# Altium footprint library LimeMicroAltiumLib_pcbLib_r01.PcbLib: 434 footprints (part 16 of 29)
Each footprint in its own frame and in the unit in brackets; x right, y up, seen from the top. Pads: shape width x height; smd on the part's side, far side on the other; paste and mask are expansions set on the pad; w line width, h text height; cw(c..) or ccw(c..) is an arc to the next point about the centre after c.
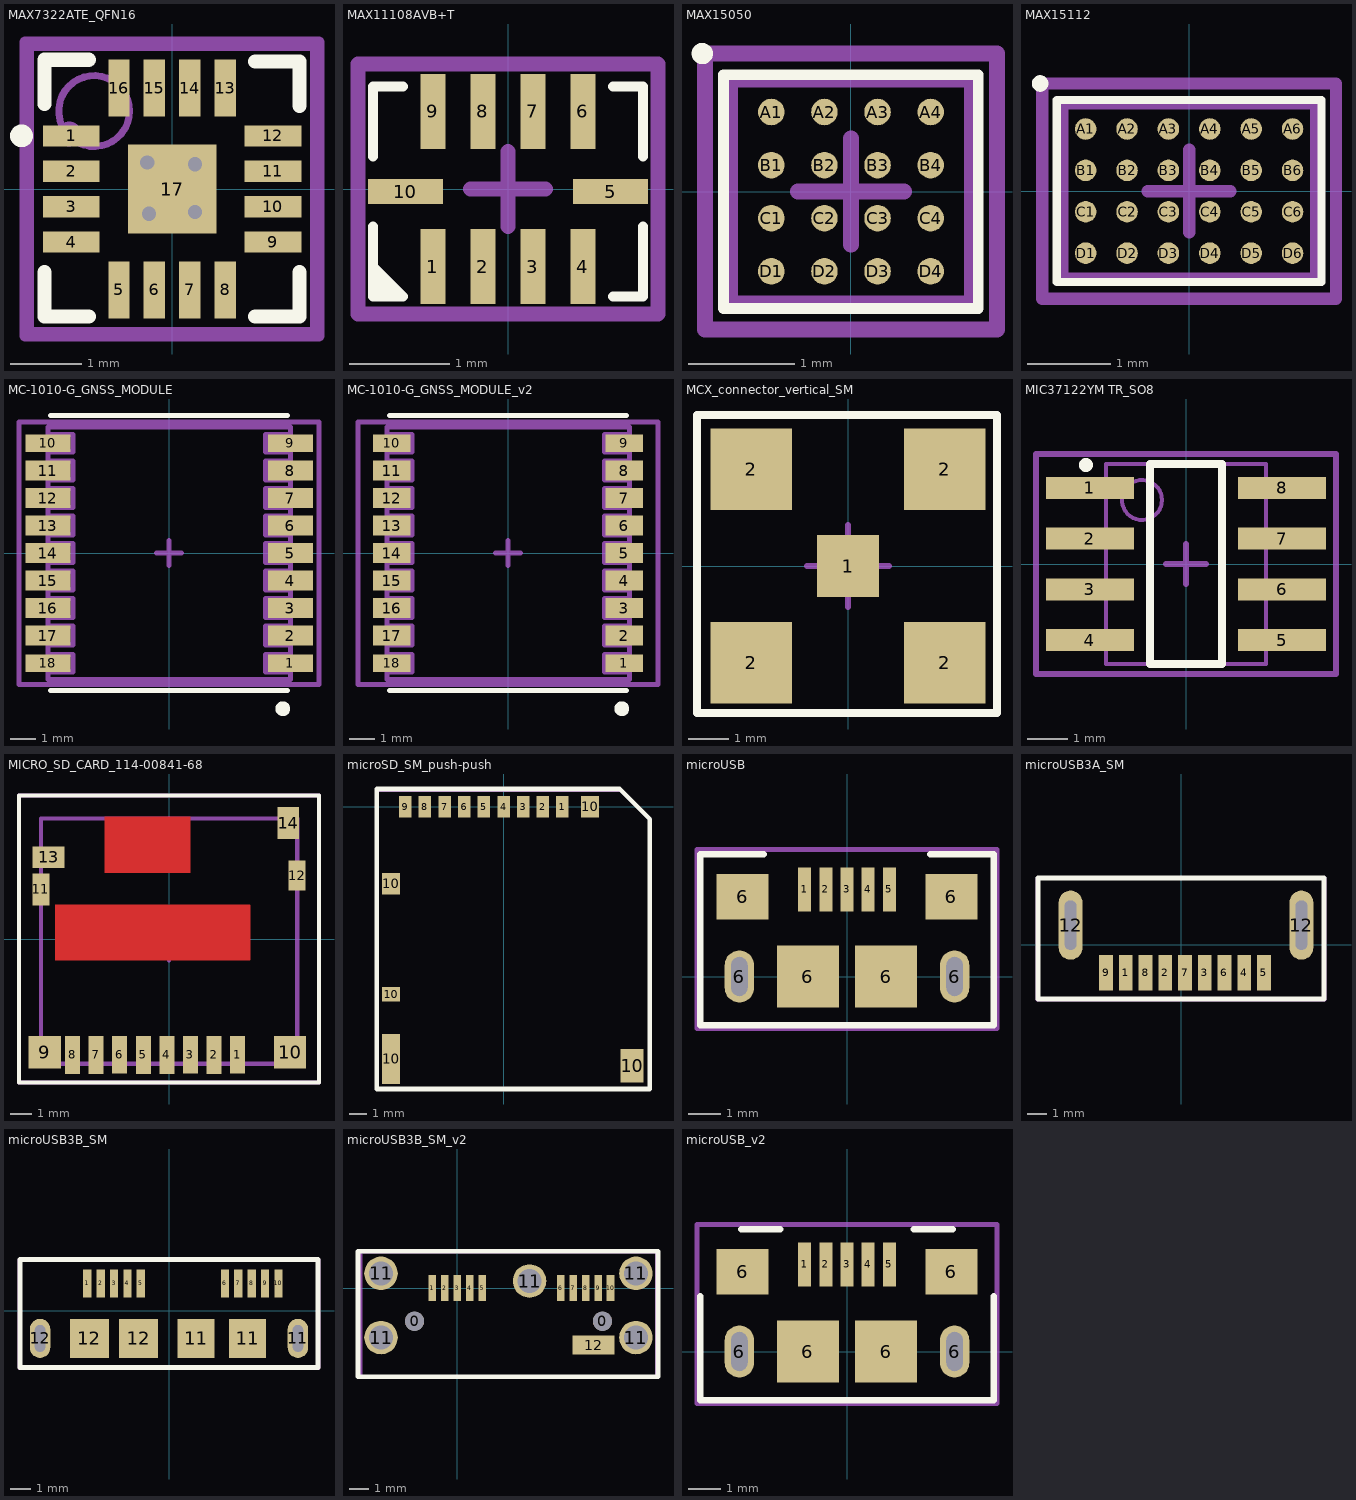
[diagram p15: the footprints below, top view; thin cyan lines are the x and y axes]

## MAX7322ATE_QFN16 [mm]
height 0.8
pads (17):
  rect 0.8x0.3 smd mask+0.05: 1(-1.425,0.75) 2(-1.425,0.25) 3(-1.425,-0.25) 4(-1.425,-0.75) 9(1.425,-0.75) 10(1.425,-0.25) 11(1.425,0.25) 12(1.425,0.75)
  rect 0.3x0.8 smd mask+0.05: 5(-0.75,-1.425) 6(-0.25,-1.425) 7(0.25,-1.425) 8(0.75,-1.425) 13(0.75,1.425) 14(0.25,1.425) 15(-0.25,1.425) 16(-0.75,1.425)
  rect 1.25x1.25 smd mask+0.05: 17(0,0)
via -0.35,0.375 diameter 0.4 hole 0.2
via 0.325,0.35 diameter 0.4 hole 0.2
via 0.325,-0.325 diameter 0.4 hole 0.2
via -0.325,-0.35 diameter 0.4 hole 0.2
Top Overlay:
  circle w0.25: c-2.125,0.75 r0.035
  lines w0.2: -1.8,-1.175 -1.8,-1.8 -1.175,-1.8 ; -1.8,1.2 -1.8,1.825 -1.175,1.825 ; 1.175,-1.8 1.8,-1.8 1.8,-1.175 ; 1.175,1.8 1.8,1.8 1.8,1.175
Mechanical 13:
  circle w0.1: c-1.1,1.1 r0.5
  lines w0.1: -2,-2 2,-2 2,2 -2,2 -2,-2
Mechanical 15:
  circle w0.35: c-1.45,0.775 r0
  lines w0.15: -0.5,0 0.5,0 ; 0,-0.5 0,0.5 ; -2.075,-2.075 2.075,-2.075 2.075,2.075 -2.075,2.075 -2.075,-2.075
  text ".Designator" at 0,0 h0.55
3D body "User Library-qfn16-3x3.step": height 0.92, standoff 0, extent -1.5,-1.5 1.5,1.5

## MAX11108AVB+T [mm]
pads (10):
  rect 0.25x0.75 smd mask+0.05: 1(-0.75,-0.775) 2(-0.25,-0.775) 3(0.25,-0.775) 4(0.75,-0.775) 6(0.75,0.775) 7(0.25,0.775) 8(-0.25,0.775) 9(-0.75,0.775)
  rect 0.75x0.25 smd mask+0.05: 5(1.025,-0.025) 10(-1.025,-0.025)
Top Overlay:
  region: -1.05,-1.075 -1.35,-0.775 -1.35,-1.075
  lines w0.1: -1.35,-0.375 -1.35,-1.075 -1.05,-1.075 -1.35,-0.775 ; -1.35,0.325 -1.35,1.025 -1.05,1.025 ; 1.05,-1.075 1.35,-1.075 1.35,-0.375 ; 1.05,1.025 1.35,1.025 1.35,0.325 ; -1.35,-0.775 -1.35,-0.775
Mechanical 15:
  circle w0.1: c-0.75,-0.75 r0.035
  lines w0.15: -0.375,0 0,0 ; 0,-0.375 0,0 ; 0,0.375 0,0 ; 0.375,0 0,0 ; -1.5,-1.25 -1.5,1.25 1.5,1.25 1.5,1.15 1.5,-1.25 1.4,-1.25 -1.5,-1.25
  text ".Designator" at 0,0 h0.55
3D body: height 0.45, standoff 0, extent -1.05,-0.8 1.05,0.8
3D body: height 0.5, standoff 0.45, extent -0.874,-0.625 -0.575,-0.325

## MAX15050 [mm] "BGA, 16-Leads, Body 2,22x2,06mmx0,25mm, Pitch 0,50mm"
height 0.25
pads (16):
  round 0.25 smd: A1(-0.75,0.75) A2(-0.25,0.75) A3(0.25,0.75) A4(0.75,0.75) B1(-0.75,0.25) B2(-0.25,0.25) B3(0.25,0.25) B4(0.75,0.25) C1(-0.75,-0.25) C2(-0.25,-0.25) C3(0.25,-0.25) C4(0.75,-0.25) D1(-0.75,-0.75) D2(-0.25,-0.75) D3(0.25,-0.75) D4(0.75,-0.75)
Top Overlay:
  circle w0.1: c-1.4,1.3 r0.05
  lines w0.1: -1.2,-1.1 -1.2,1.1 1.2,1.1 1.2,-1.1 -1.2,-1.1
Mechanical 13:
  lines w0.1: -1.115,-1.03 -1.115,1.03 1.115,1.03 1.115,-1.03 -1.115,-1.03
Mechanical 15:
  lines w0.15: -0.5,0 0.5,0 ; 0,-0.5 0,0.5 ; -1.375,-1.3 -1.375,1.3 1.375,1.3 1.375,-1.3 -1.375,-1.3
  text ".Designator" at 0,0 h0.55
  text "A1" at -1,0.6 h0.3
3D body: height 0.25, standoff 0.25, extent -1.115,-1.03 1.115,1.03

## MAX15112 [mm] "BGA, 24-Leads, Body 3,02x2,07mmx0,25mm, Pitch 0,50mm"
height 0.25
pads (24):
  round 0.26 smd: A1(-1.25,0.75) A2(-0.75,0.75) A3(-0.25,0.75) A4(0.25,0.75) A5(0.75,0.75) A6(1.25,0.75) B1(-1.25,0.25) B2(-0.75,0.25) B3(-0.25,0.25) B4(0.25,0.25) B5(0.75,0.25) B6(1.25,0.25) C1(-1.25,-0.25) C2(-0.75,-0.25) C3(-0.25,-0.25) C4(0.25,-0.25) C5(0.75,-0.25) C6(1.25,-0.25) D1(-1.25,-0.75) D2(-0.75,-0.75) D3(-0.25,-0.75) D4(0.25,-0.75) D5(0.75,-0.75) D6(1.25,-0.75)
Top Overlay:
  circle w0.1: c-1.8,1.3 r0.05
  lines w0.1: -1.6,-1.1 1.6,-1.1 1.6,1.1 -1.6,1.1 -1.6,-1.1
Mechanical 13:
  lines w0.1: -1.51,-1.035 1.51,-1.035 1.51,1.035 -1.51,1.035 -1.51,-1.035
Mechanical 15:
  lines w0.15: -0.5,0 0.5,0 ; 0,-0.5 0,0.5 ; -1.775,-1.3 1.775,-1.3 1.775,1.3 -1.775,1.3 -1.775,-1.3
  text ".Designator" at 0,0 h0.55
  text "A1" at -1.4,0.6 h0.3
3D body: height 0.25, standoff 0.25, extent -1.51,-1.035 1.51,1.035

## MC-1010-G_GNSS_MODULE [mm]
pads (18):
  rect 1.8x0.7 smd mask+0.05: 1(4.85,-4.4) 9(4.85,4.4) 10(-4.85,4.4) 18(-4.85,-4.4)
  rect 1.8x0.8 smd mask+0.05: 2(4.85,-3.3) 3(4.85,-2.2) 4(4.85,-1.1) 5(4.85,0) 6(4.85,1.1) 7(4.85,2.2) 8(4.85,3.3) 11(-4.85,3.3) 12(-4.85,2.2) 13(-4.85,1.1) 14(-4.85,0) 15(-4.85,-1.1) 16(-4.85,-2.2) 17(-4.85,-3.3)
Top Overlay:
  circle w0.3: c4.55,-6.225 r0.146
  lines w0.2: -4.75,-5.5 4.75,-5.5 ; -4.75,5.5 4.75,5.5
Mechanical 13:
  lines w0.2: -4.534,-4.434 cw(c-4.85,-4.434) -4.85,-4.75 -3.85,-4.75 -3.85,-4.05 -4.85,-4.05 cw(c-4.85,-4.366) -4.534,-4.366 ; -4.534,4.366 cw(c-4.85,4.366) -4.85,4.05 -3.85,4.05 -3.85,4.75 -4.85,4.75 cw(c-4.85,4.434) -4.534,4.434 ; 4.534,-4.434 ccw(c4.85,-4.434) 4.85,-4.75 3.85,-4.75 3.85,-4.05 4.85,-4.05 ccw(c4.85,-4.366) 4.534,-4.366 ; 4.534,4.366 ccw(c4.85,4.366) 4.85,4.05 3.85,4.05 3.85,4.75 4.85,4.75 ccw(c4.85,4.434) 4.534,4.434 ; -4.85,-5.05 -4.85,5.05 4.85,5.05 4.85,-5.05 -4.85,-5.05 ; -4.85,-3.675 ccw(c-4.85,-3.359) -4.534,-3.359 -4.534,-3.241 ccw(c-4.85,-3.241) -4.85,-2.925 -3.85,-2.925 -3.85,-3.675 -4.85,-3.675 ; -4.85,-2.575 ccw(c-4.85,-2.259) -4.534,-2.259 -4.534,-2.141 ccw(c-4.85,-2.141) -4.85,-1.825 -3.85,-1.825 -3.85,-2.575 -4.85,-2.575 ; -4.85,-1.475 ccw(c-4.85,-1.159) -4.534,-1.159 -4.534,-1.041 ccw(c-4.85,-1.041) -4.85,-0.725 -3.85,-0.725 -3.85,-1.475 -4.85,-1.475 ; -4.85,-0.375 ccw(c-4.85,-0.059) -4.534,-0.059 -4.534,0.059 ccw(c-4.85,0.059) -4.85,0.375 -3.85,0.375 -3.85,-0.375 -4.85,-0.375 ; -4.85,0.725 ccw(c-4.85,1.041) -4.534,1.041 -4.534,1.159 ccw(c-4.85,1.159) -4.85,1.475 -3.85,1.475 -3.85,0.725 -4.85,0.725 ; -4.85,1.825 ccw(c-4.85,2.141) -4.534,2.141 -4.534,2.259 ccw(c-4.85,2.259) -4.85,2.575 -3.85,2.575 -3.85,1.825 -4.85,1.825 ; -4.85,2.925 ccw(c-4.85,3.241) -4.534,3.241 -4.534,3.359 ccw(c-4.85,3.359) -4.85,3.675 -3.85,3.675 -3.85,2.925 -4.85,2.925 ; 3.85,-3.675 4.85,-3.675 cw(c4.85,-3.359) 4.534,-3.359 4.534,-3.241 cw(c4.85,-3.241) 4.85,-2.925 3.85,-2.925 3.85,-3.675 ; 3.85,-2.575 3.85,-1.825 4.85,-1.825 ccw(c4.85,-2.141) 4.534,-2.141 4.534,-2.259 ccw(c4.85,-2.259) 4.85,-2.575 3.85,-2.575 ; 3.85,-1.475 3.85,-0.725 4.85,-0.725 ccw(c4.85,-1.041) 4.534,-1.041 4.534,-1.159 ccw(c4.85,-1.159) 4.85,-1.475 3.85,-1.475 ; 3.85,-0.375 3.85,0.375 4.85,0.375 ccw(c4.85,0.059) 4.534,0.059 4.534,-0.059 ccw(c4.85,-0.059) 4.85,-0.375 3.85,-0.375 ; 3.85,0.725 4.85,0.725 cw(c4.85,1.041) 4.534,1.041 4.534,1.159 cw(c4.85,1.159) 4.85,1.475 3.85,1.475 3.85,0.725 ; 3.85,1.825 4.85,1.825 cw(c4.85,2.141) 4.534,2.141 4.534,2.259 cw(c4.85,2.259) 4.85,2.575 3.85,2.575 3.85,1.825 ; 3.85,2.925 3.85,3.675 4.85,3.675 ccw(c4.85,3.359) 4.534,3.359 4.534,3.241 ccw(c4.85,3.241) 4.85,2.925 3.85,2.925
Mechanical 15:
  lines w0.2: -0.5,0 0.5,0 ; 0,-0.5 0,0.5 ; -6,-5.25 6,-5.25 6,5.25 -6,5.25 -6,-5.25
  text "18" at -5.25,-4.75 h0.55
  text "10" at -5.25,4.25 h0.55
  text "9" at 4.75,4.25 h0.55
  text "1" at 4.75,-4.75 h0.55
  text ".Designator" at 0,0 h0.55
3D body: height 2, standoff 0, extent -4.85,-5.05 4.85,5.05

## MC-1010-G_GNSS_MODULE_v2 [mm]
pads (18):
  rect 1.5x0.7 smd mask+0.05: 1(4.65,-4.4) 9(4.65,4.4) 10(-4.65,4.4) 18(-4.65,-4.4)
  rect 1.5x0.8 smd mask+0.05: 2(4.65,-3.3) 3(4.65,-2.2) 4(4.65,-1.1) 5(4.65,0) 6(4.65,1.1) 7(4.65,2.2) 8(4.65,3.3) 11(-4.65,3.3) 12(-4.65,2.2) 13(-4.65,1.1) 14(-4.65,0) 15(-4.65,-1.1) 16(-4.65,-2.2) 17(-4.65,-3.3)
Top Overlay:
  circle w0.3: c4.55,-6.225 r0.146
  lines w0.2: -4.75,-5.5 4.75,-5.5 ; -4.75,5.5 4.75,5.5
Mechanical 13:
  lines w0.2: -4.534,-4.434 cw(c-4.85,-4.434) -4.85,-4.75 -3.85,-4.75 -3.85,-4.05 -4.85,-4.05 cw(c-4.85,-4.366) -4.534,-4.366 ; -4.534,4.366 cw(c-4.85,4.366) -4.85,4.05 -3.85,4.05 -3.85,4.75 -4.85,4.75 cw(c-4.85,4.434) -4.534,4.434 ; 4.534,-4.434 ccw(c4.85,-4.434) 4.85,-4.75 3.85,-4.75 3.85,-4.05 4.85,-4.05 ccw(c4.85,-4.366) 4.534,-4.366 ; 4.534,4.366 ccw(c4.85,4.366) 4.85,4.05 3.85,4.05 3.85,4.75 4.85,4.75 ccw(c4.85,4.434) 4.534,4.434 ; -4.85,-5.05 4.85,-5.05 4.85,5.05 -4.85,5.05 -4.85,-5.05 ; -4.85,-3.675 ccw(c-4.85,-3.359) -4.534,-3.359 -4.534,-3.241 ccw(c-4.85,-3.241) -4.85,-2.925 -3.85,-2.925 -3.85,-3.675 -4.85,-3.675 ; -4.85,-2.575 ccw(c-4.85,-2.259) -4.534,-2.259 -4.534,-2.141 ccw(c-4.85,-2.141) -4.85,-1.825 -3.85,-1.825 -3.85,-2.575 -4.85,-2.575 ; -4.85,-1.475 ccw(c-4.85,-1.159) -4.534,-1.159 -4.534,-1.041 ccw(c-4.85,-1.041) -4.85,-0.725 -3.85,-0.725 -3.85,-1.475 -4.85,-1.475 ; -4.85,-0.375 ccw(c-4.85,-0.059) -4.534,-0.059 -4.534,0.059 ccw(c-4.85,0.059) -4.85,0.375 -3.85,0.375 -3.85,-0.375 -4.85,-0.375 ; -4.85,0.725 ccw(c-4.85,1.041) -4.534,1.041 -4.534,1.159 ccw(c-4.85,1.159) -4.85,1.475 -3.85,1.475 -3.85,0.725 -4.85,0.725 ; -4.85,1.825 ccw(c-4.85,2.141) -4.534,2.141 -4.534,2.259 ccw(c-4.85,2.259) -4.85,2.575 -3.85,2.575 -3.85,1.825 -4.85,1.825 ; -4.85,2.925 ccw(c-4.85,3.241) -4.534,3.241 -4.534,3.359 ccw(c-4.85,3.359) -4.85,3.675 -3.85,3.675 -3.85,2.925 -4.85,2.925 ; 3.85,-3.675 3.85,-2.925 4.85,-2.925 ccw(c4.85,-3.241) 4.534,-3.241 4.534,-3.359 ccw(c4.85,-3.359) 4.85,-3.675 3.85,-3.675 ; 3.85,-2.575 4.85,-2.575 cw(c4.85,-2.259) 4.534,-2.259 4.534,-2.141 cw(c4.85,-2.141) 4.85,-1.825 3.85,-1.825 3.85,-2.575 ; 3.85,-1.475 4.85,-1.475 cw(c4.85,-1.159) 4.534,-1.159 4.534,-1.041 cw(c4.85,-1.041) 4.85,-0.725 3.85,-0.725 3.85,-1.475 ; 3.85,-0.375 4.85,-0.375 cw(c4.85,-0.059) 4.534,-0.059 4.534,0.059 cw(c4.85,0.059) 4.85,0.375 3.85,0.375 3.85,-0.375 ; 3.85,0.725 3.85,1.475 4.85,1.475 ccw(c4.85,1.159) 4.534,1.159 4.534,1.041 ccw(c4.85,1.041) 4.85,0.725 3.85,0.725 ; 3.85,1.825 3.85,2.575 4.85,2.575 ccw(c4.85,2.259) 4.534,2.259 4.534,2.141 ccw(c4.85,2.141) 4.85,1.825 3.85,1.825 ; 3.85,2.925 4.85,2.925 cw(c4.85,3.241) 4.534,3.241 4.534,3.359 cw(c4.85,3.359) 4.85,3.675 3.85,3.675 3.85,2.925
Mechanical 15:
  lines w0.2: -0.5,0 0.5,0 ; 0,-0.5 0,0.5 ; -6,-5.25 -6,5.25 6,5.25 6,-5.25 -6,-5.25
  text ".Designator" at 0,0 h0.55
  text "1" at 4.75,-4.75 h0.55
  text "9" at 4.75,4.25 h0.55
  text "10" at -5.25,4.25 h0.55
  text "18" at -5.25,-4.75 h0.55
3D body: height 2, standoff 0, extent -4.85,-5.05 4.85,5.05

## MCX_connector_vertical_SM [mm]
pads (5):
  rect 1.52x1.52 smd: 1(0,0)
  rect 2x2 smd: 2(-2.37,-2.37) 2(-2.37,2.37) 2(2.37,-2.37) 2(2.37,2.37)
Top Overlay:
  lines w0.2: -3.7,-3.6 -3.7,3.7 3.65,3.7 3.65,-3.6 -3.7,-3.6
Mechanical 15:
  lines w0.15: -1,0 0,0 ; 0,-1 0,0 ; 0,1 0,0 ; 1,0 0,0 ; -3.7,-3.6 3.65,-3.6 3.65,3.7 -3.7,3.7 -3.7,-3.6
  text ".Designator" at 0,0 h0.55
3D body "User Library-MCX_SMD_v1.step": height 5.9, standoff 0, extent -2.95,-2.95 2.95,2.95

## MECH_JUMPER_HALF_PITCH [mm]
3D body "User Library-PinHeader50mil.STEP": height 7.3, standoff 1.8, extent -1.25,-0.575 1.25,0.625

## MIC37122YM TR_SO8 [mm] "SOIC, 8-Leads, Body 4,90x3,90mm, Pitch 1,27mm, IPC Medium Density"
height 1.7
pads (8):
  rect 2.2x0.55 smd: 1(-2.4,1.905) 2(-2.4,0.635) 3(-2.4,-0.635) 4(-2.4,-1.905) 5(2.4,-1.905) 6(2.4,-0.635) 7(2.4,0.635) 8(2.4,1.905)
Top Overlay:
  circle w0.25: c-2.5,2.475 r0.05
  lines w0.2: -0.9,-2.5 -0.9,2.5 0.9,2.5 0.9,-2.5 -0.9,-2.5
Mechanical 13:
  circle w0.1: c-1.1,1.6 r0.5
  lines w0.1: -2,-2.5 -2,2.5 2,2.5 2,-2.5 -2,-2.5
Mechanical 15:
  circle w0.35: c-2.8,1.9 r0.1
  lines w0.15: -0.5,0 0.5,0 ; 0,-0.5 0,0.5 ; -3.75,-2.75 -3.75,2.75 3.75,2.75 3.75,-2.75 -3.75,-2.75
  text ".Designator" at 0,0 h0.55
3D body "CircuitWorks-SO-8.step": height 1.45, standoff 0, extent -2.889,-2.45 2.889,2.452

## MICRO_SD_CARD_114-00841-68 [mm]
pads (14):
  rect 0.7x1.75 smd mask+0.1: 1(3.2,-5.412) 6(-2.3,-5.412)
  rect 0.701x1.753 smd mask+0.1: 2(2.1,-5.412) 8(-4.5,-5.412)
  rect 0.701x1.752 smd mask+0.1: 3(1,-5.412) 4(-0.1,-5.412) 5(-1.2,-5.412) 7(-3.4,-5.412)
  rect 1.501x1.501 smd mask+0.1: 9(-5.8,-5.288)
  rect 1.502x1.502 smd mask+0.1: 10(5.65,-5.288)
  rect 0.801x1.501 smd mask+0.1: 11(-5.975,2.312)
  rect 0.8x1.401 smd mask+0.1: 12(5.975,2.963)
  rect 1.5x1 smd mask+0.1: 13(-5.62,3.812)
  rect 1.001x1.502 smd mask+0.1: 14(5.575,5.413)
Top Layer:
  pour cut-out: 3.8,-1 -5.3,-1 -5.3,1.6 3.8,1.6
  pour cut-out: 1,3.1 -3,3.1 -3,5.7 1,5.7
Top Overlay:
  lines w0.2: -7,-6.7 -7,6.7 7,6.7 7,-6.7 -7,-6.7
Top Solder:
  region: -6.475,3.15 -6.475,4.425 -4.75,4.425 -4.75,3.2 -5.475,3.2 -5.475,3.15
Mechanical 13:
  lines w0.2: -5.975,-5.841 -5.975,5.626 ; -5.975,-5.826 5.976,-5.826 ; -5.975,-4.145 -5.975,-0.109 ; -5.975,-0.104 -5.975,1.237 ; 4.656,5.626 -5.975,5.626 ; 5.982,-5.831 5.982,5.626 ; 5.985,-4.215 5.985,-0.104 ; 5.988,-0.105 5.988,2.043 ; 5.988,5.626 -5.975,5.626
Mechanical 15:
  lines w0.2: -1,0 0,0 ; 0,-1 0,0 ; 0,1 0,0 ; 1,0 0,0 ; -7,-6.7 -7,6.7 7,6.7 7,-6.7 -7,-6.7
  text ".Designator" at 0,0 h0.55
  text "1" at 3.1,-4.4 h0.55
  text "8" at -4.6,-4.4 h0.55
3D body "User Library-Micro SD Holder 114-00841-68.step": height 1.6, standoff 0, extent -6,-5.85 6,5.75
3D body "User Library-Micro_SD.step": height 1.45, standoff 0.47, extent -5.5,-9.9 5.5,5.1

## microSD_SM_push-push [mm]
pads (14):
  rect 0.7x1.2 smd: 1(3.3,0) 2(2.2,0) 3(1.1,0) 4(0,0) 5(-1.1,0) 6(-2.2,0) 7(-3.3,0) 8(-4.4,0) 9(-5.5,0)
  rect 1x2.8 smd: 10(-6.3,-14.11)
  rect 1x0.8 smd: 10(-6.3,-10.5)
  rect 1x1.2 smd: 10(-6.3,-4.3) 10(4.85,0)
  rect 1.3x1.9 smd: 10(7.2,-14.5)
Top Overlay:
  lines w0.254: -7.1,-15.8 8.2,-15.8 8.2,-0.7 6.5,1 -7.1,1 -7.1,-15.8
Mechanical 15:
  lines w0.15: -7.1,-15.8 8.2,-15.8 8.2,-0.675 6.625,0.9 -7,0.9 -7.1,1 -7.1,-15.8
  text ".Designator" at 0.4,-8.1 h0.55

## microUSB [mm]
pads (11):
  rect 0.4x1.35 smd mask+0.05: 1(-1.3,2.675) 2(-0.65,2.675) 3(0,2.675) 4(0.65,2.675) 5(1.3,2.675)
  oval 0.9x1.6 hole 0.5 slot 1.2 at 90 deg: 6(-3.3,0) 6(3.3,0)
  rect 1.6x1.4 smd: 6(-3.2,2.45) 6(3.2,2.45)
  rect 1.9x1.9 smd: 6(-1.2,0) 6(1.2,0)
Top Overlay:
  lines w0.2: -2.55,3.75 -4.5,3.75 -4.5,-1.5 4.5,-1.5 4.5,3.75 2.55,3.75
Mechanical 15:
  lines w0.15: -4.6,-1.6 -4.6,3.9 4.6,3.9 4.6,-1.6 -4.6,-1.6
  text ".Designator" at 0,1.3 h0.55
3D body "USB3090-30-A_revE.step": height 2.59, standoff -1, extent -3.891,-2.565 3.892,2.925

## microUSB3A_SM [mm]
pads (11):
  rect 0.7x1.8 smd: 1(-2.8,-1.4) 2(-0.8,-1.4) 3(1.2,-1.4) 4(3.2,-1.4) 5(4.2,-1.4) 6(2.2,-1.4) 7(0.2,-1.4) 8(-1.8,-1.4) 9(-3.8,-1.4)
  oval 1.2x3.5 hole 0.6 slot 2.5 at 90 deg: 12(-5.6,1) 12(6.1,1)
Top Overlay:
  lines w0.254: -7.25,-2.75 -7.25,3.4 7.25,3.4 7.25,-2.75 -7.25,-2.75
Mechanical 15:
  lines w0.15: -7.3,-2.8 -7.3,3.4 7.3,3.4 7.3,-2.8 -7.3,-2.8
  text ".Designator" at 0,0.1 h0.55
3D body "692112030100.stp": height 1.8, standoff -2.7, extent -5.8,-1.954 6.2,18.8

## microUSB3B_SM [mm]
pads (16):
  rect 0.4x1.35 smd mask+0.05: 1(-3.975,1.338) 2(-3.325,1.338) 3(-2.675,1.338) 4(-2.025,1.338) 5(-1.375,1.338) 6(2.725,1.338) 7(3.375,1.338) 8(4.025,1.338) 9(4.675,1.338) 10(5.325,1.338)
  rect 1.8x1.9 smd: 11(1.325,-1.338) 11(3.825,-1.338)
  oval 1x1.9 hole 0.5 slot 1.3 at 90 deg: 11(6.275,-1.338) 12(-6.275,-1.338)
  rect 1.9x1.9 smd: 12(-3.875,-1.338) 12(-1.475,-1.338)
Top Overlay:
  lines w0.254: -7.25,-2.75 -7.25,2.5 7.25,2.5 7.25,-2.75 -7.25,-2.75
Mechanical 15:
  lines w0.15: -7.3,-2.8 -7.3,2.5 7.3,2.5 7.3,-2.8 -7.3,-2.8
  text ".Designator" at 0,0.1 h0.55
3D body "USB3110-30-A_revF.step": height 2.73, standoff -1, extent -6.707,-4.118 6.707,1.8

## microUSB3B_SM_v2 [mm] "GSB443T33HRCT-ND"
pads (18):
  round 1 hole 1: 0(-2.225,-1.73) 0(7.575,-1.73)
  rect 0.4x1.35 smd mask+0.05: 1(-1.3,0) 2(-0.65,0) 3(0,0) 4(0.65,0) 5(1.3,0) 6(5.4,0) 7(6.05,0) 8(6.7,0) 9(7.35,0) 10(8,0)
  round 1.75 hole 1.25: 11(-3.975,-2.58) 11(-3.975,0.77) 11(3.775,0.37) 11(9.325,-2.58) 11(9.325,0.77)
  rect 2.18x0.98 smd: 12(7.115,-2.97)
Top Overlay:
  lines w0.254: -5.175,-4.625 -5.175,1.925 10.475,1.925 10.475,-4.625 -5.175,-4.625
Mechanical 15:
  lines w0.15: -5.025,-4.625 -5.025,1.875 10.4,1.875 10.4,-4.625 -5.025,-4.625
  text ".Designator" at 2.675,-1.238 h0.55
3D body "USB3110-30-A_revF.step": height 5.73, standoff 2, extent -4.032,-6.525 9.382,-0.607
3D body: height 4, standoff 0, extent -4.032,-4.625 9.382,-0.607

## microUSB_v2 [mm]
pads (11):
  rect 0.4x1.35 smd mask+0.05: 1(-1.3,2.675) 2(-0.65,2.675) 3(0,2.675) 4(0.65,2.675) 5(1.3,2.675)
  oval 0.9x1.6 hole 0.5 slot 1.2 at 90 deg: 6(-3.3,0) 6(3.3,0)
  rect 1.6x1.4 smd: 6(-3.2,2.45) 6(3.2,2.45)
  rect 1.9x1.9 smd: 6(-1.2,0) 6(1.2,0)
Top Overlay:
  lines w0.2: -4.5,1.7 -4.5,-1.5 4.5,-1.5 4.5,1.7 ; -3.25,3.75 -2.05,3.75 ; 2.05,3.75 3.25,3.75
Mechanical 15:
  lines w0.15: -4.6,-1.6 4.6,-1.6 4.6,3.9 -4.6,3.9 -4.6,-1.6
  text ".Designator" at 0,1.3 h0.55
3D body "USB3090-30-A_revE.step": height 2.59, standoff -1, extent -3.891,-2.565 3.892,2.925